# Altium footprint library 2.52-直插元件.PcbLib: 467 footprints (part 22 of 30)
Each footprint in its own frame and in the unit in brackets; x right, y up, seen from the top. Pads: shape width x height; smd on the part's side, far side on the other; paste and mask are expansions set on the pad; w line width, h text height; cw(c..) or ccw(c..) is an arc to the next point about the centre after c.
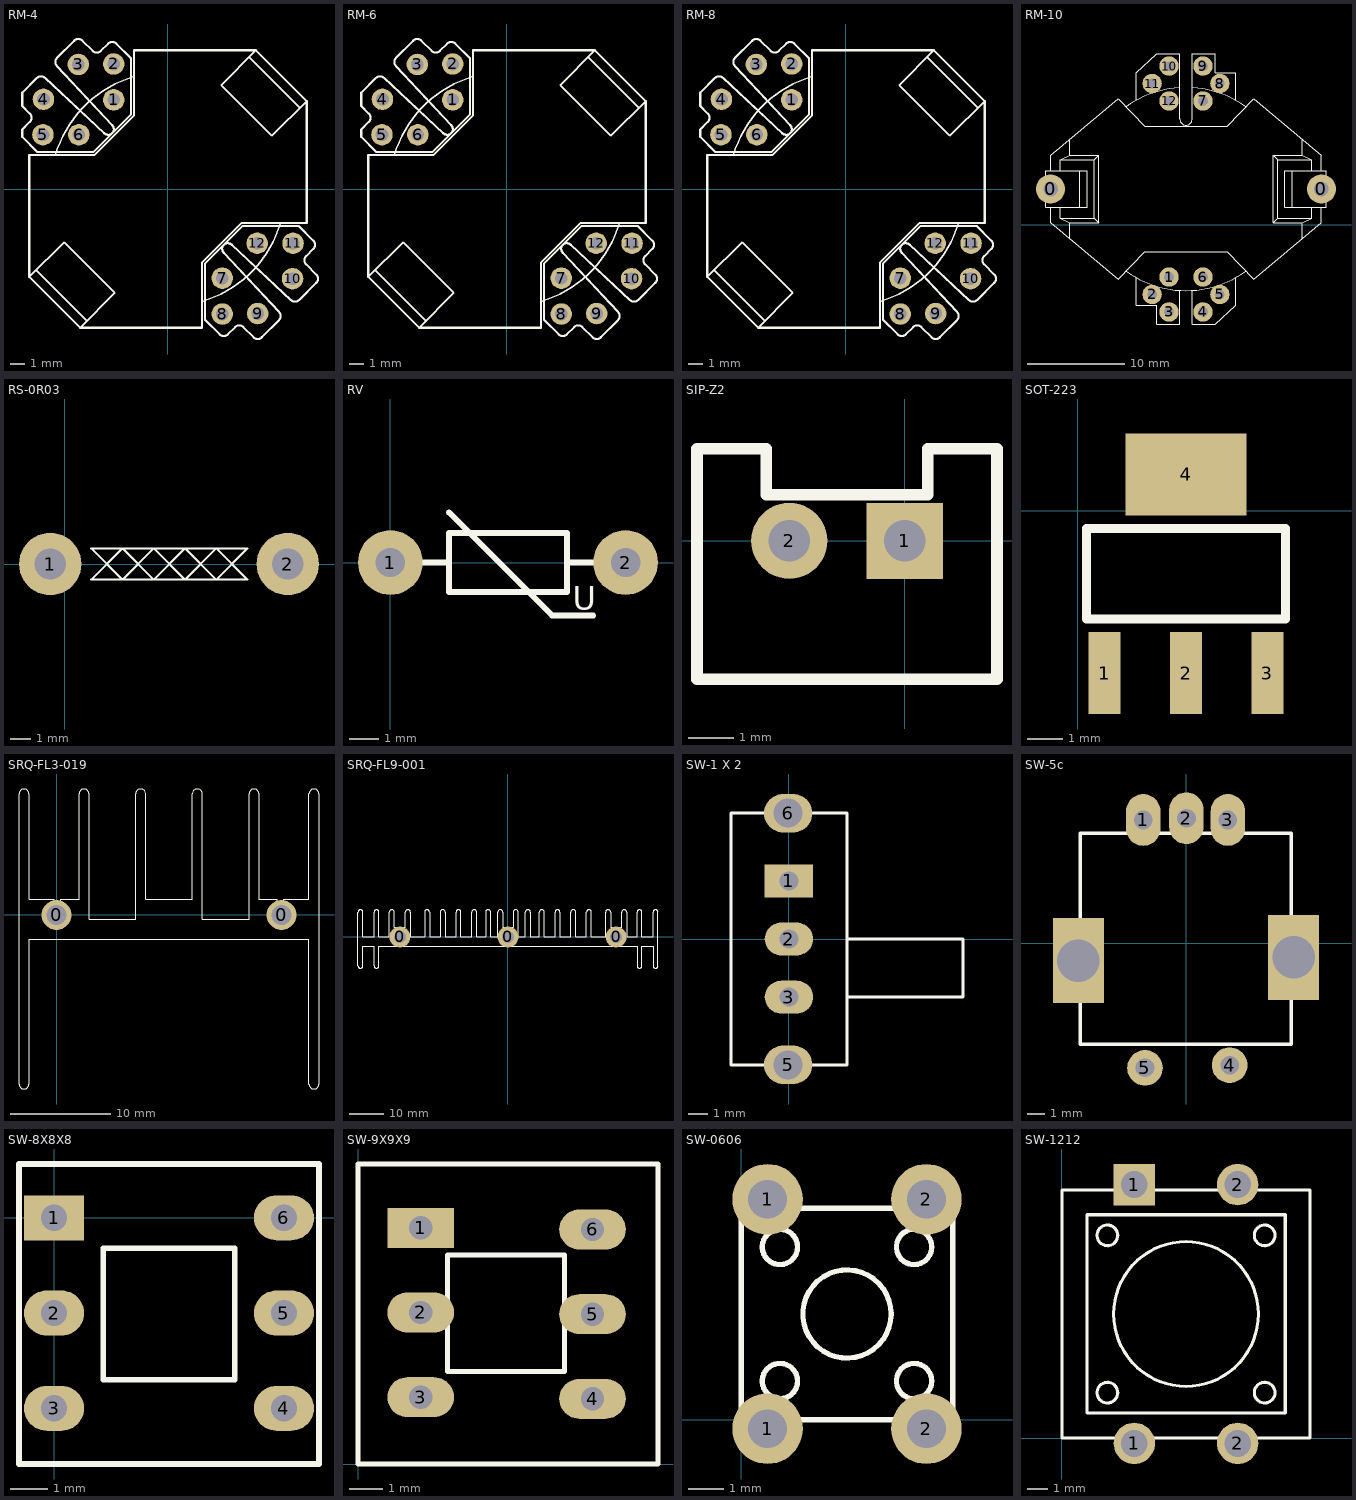
[diagram p21: the footprints below, top view; thin cyan lines are the x and y axes]

## RM-4 [mil]
pads (12):
  round 60 hole 35.43: 1(-151.72,249.16) 2(-151.72,349.38) 3(-250.55,347.99) 4(-347.99,250.55) 5(-349.38,151.72) 6(-249.16,151.72) 7(151.72,-249.16) 8(151.72,-349.38) 9(250.55,-347.99) 10(347.99,-250.55) 11(349.38,-151.72) 12(249.16,-151.72)
Top Overlay:
  lines w3.94: -387.66,-245.68 -290.22,-148.24 -148.24,-290.22 -245.68,-387.66 ; -368.59,-226.61 -226.61,-368.59 ; -314.81,94.69 cw(c0,0) -94.74,314.79 ; 94.69,-314.81 ccw(c0,0) 314.79,-94.73 ; 226.61,368.59 368.59,226.61 ; 245.68,387.66 148.24,290.22 290.22,148.24 387.66,245.68
  lines w5.91: -407.35,145.67 -364.69,103 -208.79,103 -103,208.79 ; -407.35,146.42 -407.34,166.14 -385.93,187.55 ccw(c-397.37,198.99) -385.93,210.43 -407.34,231.84 ; -407.34,231.96 -407.34,269.03 -366.33,310.04 cw(c-354.89,298.6) -343.45,310.04 ; -343.1,310.41 -178.4,155.77 ; -310.41,343.1 -155.77,178.4 ; -310.1,366.39 -262.05,414.44 cw(c-250.61,403) -239.16,414.44 -210.66,385.93 ; -310.04,343.45 cw(c-298.6,354.89) -310.04,366.33 ; -210.43,385.93 ccw(c-198.99,397.37) -187.55,385.93 -167.4,406.09 cw(c-155.95,394.64) -144.51,406.09 -103.37,364.94 ccw(c-103.31,365) -103.25,364.94 -103.25,208.93 ; -178.22,155.95 ccw(c-167.09,167.09) -155.95,178.22 ; 103,-364.69 103,-208.79 208.79,-103 ; 103.37,-364.94 144.51,-406.09 ccw(c155.95,-394.64) 167.39,-406.09 187.55,-385.93 cw(c198.99,-397.37) 210.43,-385.93 ; 155.77,-178.4 310.41,-343.1 ; 155.95,-178.22 cw(c167.09,-167.09) 178.22,-155.95 ; 178.4,-155.77 343.1,-310.41 ; 208.93,-103.25 364.94,-103.25 ; 210.66,-385.93 239.16,-414.44 ccw(c250.61,-403) 262.05,-414.44 310.1,-366.39 ; 310.04,-366.33 ccw(c298.6,-354.89) 310.04,-343.45 ; 343.45,-310.04 ccw(c354.89,-298.6) 366.33,-310.04 ; 364.94,-103.37 406.09,-144.51 cw(c394.64,-155.95) 406.09,-167.39 385.93,-187.55 ccw(c397.37,-198.99) 385.93,-210.43 ; 366.39,-310.1 414.44,-262.05 ccw(c403,-250.61) 414.44,-239.16 385.93,-210.66 ; -387.66,-245.68 -245.68,-387.66 94.65,-387.66 94.65,-206.01 206.01,-94.65 387.66,-94.65 387.66,245.68 245.68,387.66 -94.65,387.66 -94.65,206.01 -206.01,94.65 -387.66,94.65 -387.66,-245.68
3D body "rm8.STEP": height 647.05, standoff -116.73, extent -417.83,-417.83 417.83,417.83

## RM-6 [mil]
pads (12):
  round 60 hole 35.43: 1(-151.72,249.16) 2(-151.72,349.38) 3(-250.55,347.99) 4(-347.99,250.55) 5(-349.38,151.72) 6(-249.16,151.72) 7(151.72,-249.16) 8(151.72,-349.38) 9(250.55,-347.99) 10(347.99,-250.55) 11(349.38,-151.72) 12(249.16,-151.72)
Top Overlay:
  lines w3.94: -387.66,-245.68 -290.22,-148.24 -148.24,-290.22 -245.68,-387.66 ; -368.59,-226.61 -226.61,-368.59 ; -314.81,94.69 cw(c0,0) -94.74,314.79 ; 94.69,-314.81 ccw(c0,0) 314.79,-94.73 ; 226.61,368.59 368.59,226.61 ; 245.68,387.66 148.24,290.22 290.22,148.24 387.66,245.68
  lines w5.91: -407.35,145.67 -364.69,103 -208.79,103 -103,208.79 ; -407.35,146.42 -407.34,166.14 -385.93,187.55 ccw(c-397.37,198.99) -385.93,210.43 -407.34,231.84 ; -407.34,231.96 -407.34,269.03 -366.33,310.04 cw(c-354.89,298.6) -343.45,310.04 ; -343.1,310.41 -178.4,155.77 ; -310.41,343.1 -155.77,178.4 ; -310.1,366.39 -262.05,414.44 cw(c-250.61,403) -239.16,414.44 -210.66,385.93 ; -310.04,343.45 cw(c-298.6,354.89) -310.04,366.33 ; -210.43,385.93 ccw(c-198.99,397.37) -187.55,385.93 -167.4,406.09 cw(c-155.95,394.64) -144.51,406.09 -103.37,364.94 ccw(c-103.31,365) -103.25,364.94 -103.25,208.93 ; -178.22,155.95 ccw(c-167.09,167.09) -155.95,178.22 ; 103,-364.69 103,-208.79 208.79,-103 ; 103.37,-364.94 144.51,-406.09 ccw(c155.95,-394.64) 167.39,-406.09 187.55,-385.93 cw(c198.99,-397.37) 210.43,-385.93 ; 155.77,-178.4 310.41,-343.1 ; 155.95,-178.22 cw(c167.09,-167.09) 178.22,-155.95 ; 178.4,-155.77 343.1,-310.41 ; 208.93,-103.25 364.94,-103.25 ; 210.66,-385.93 239.16,-414.44 ccw(c250.61,-403) 262.05,-414.44 310.1,-366.39 ; 310.04,-366.33 ccw(c298.6,-354.89) 310.04,-343.45 ; 343.45,-310.04 ccw(c354.89,-298.6) 366.33,-310.04 ; 364.94,-103.37 406.09,-144.51 cw(c394.64,-155.95) 406.09,-167.39 385.93,-187.55 ccw(c397.37,-198.99) 385.93,-210.43 ; 366.39,-310.1 414.44,-262.05 ccw(c403,-250.61) 414.44,-239.16 385.93,-210.66 ; -387.66,-245.68 -387.66,94.65 -206.01,94.65 -94.65,206.01 -94.65,387.66 245.68,387.66 387.66,245.68 387.66,-94.65 206.01,-94.65 94.65,-206.01 94.65,-387.66 -245.68,-387.66 -387.66,-245.68
3D body "rm8.STEP": height 647.05, standoff -116.73, extent -417.83,-417.83 417.83,417.83

## RM-8 [mil]
pads (12):
  round 60 hole 35.43: 1(-151.72,249.16) 2(-151.72,349.38) 3(-250.55,347.99) 4(-347.99,250.55) 5(-349.38,151.72) 6(-249.16,151.72) 7(151.72,-249.16) 8(151.72,-349.38) 9(250.55,-347.99) 10(347.99,-250.55) 11(349.38,-151.72) 12(249.16,-151.72)
Top Overlay:
  lines w3.94: -387.66,-245.68 -290.22,-148.24 -148.24,-290.22 -245.68,-387.66 ; -368.59,-226.61 -226.61,-368.59 ; -314.81,94.69 cw(c0,0) -94.74,314.79 ; 94.69,-314.81 ccw(c0,0) 314.79,-94.73 ; 226.61,368.59 368.59,226.61 ; 245.68,387.66 148.24,290.22 290.22,148.24 387.66,245.68
  lines w5.91: -407.35,145.67 -364.69,103 -208.79,103 -103,208.79 ; -407.35,146.42 -407.34,166.14 -385.93,187.55 ccw(c-397.37,198.99) -385.93,210.43 -407.34,231.84 ; -407.34,231.96 -407.34,269.03 -366.33,310.04 cw(c-354.89,298.6) -343.45,310.04 ; -343.1,310.41 -178.4,155.77 ; -310.41,343.1 -155.77,178.4 ; -310.1,366.39 -262.05,414.44 cw(c-250.61,403) -239.16,414.44 -210.66,385.93 ; -310.04,343.45 cw(c-298.6,354.89) -310.04,366.33 ; -210.43,385.93 ccw(c-198.99,397.37) -187.55,385.93 -167.4,406.09 cw(c-155.95,394.64) -144.51,406.09 -103.37,364.94 ccw(c-103.31,365) -103.25,364.94 -103.25,208.93 ; -178.22,155.95 ccw(c-167.09,167.09) -155.95,178.22 ; 103,-364.69 103,-208.79 208.79,-103 ; 103.37,-364.94 144.51,-406.09 ccw(c155.95,-394.64) 167.39,-406.09 187.55,-385.93 cw(c198.99,-397.37) 210.43,-385.93 ; 155.77,-178.4 310.41,-343.1 ; 155.95,-178.22 cw(c167.09,-167.09) 178.22,-155.95 ; 178.4,-155.77 343.1,-310.41 ; 208.93,-103.25 364.94,-103.25 ; 210.66,-385.93 239.16,-414.44 ccw(c250.61,-403) 262.05,-414.44 310.1,-366.39 ; 310.04,-366.33 ccw(c298.6,-354.89) 310.04,-343.45 ; 343.45,-310.04 ccw(c354.89,-298.6) 366.33,-310.04 ; 364.94,-103.37 406.09,-144.51 cw(c394.64,-155.95) 406.09,-167.39 385.93,-187.55 ccw(c397.37,-198.99) 385.93,-210.43 ; 366.39,-310.1 414.44,-262.05 ccw(c403,-250.61) 414.44,-239.16 385.93,-210.66 ; -387.66,-245.68 -387.66,94.65 -206.01,94.65 -94.65,206.01 -94.65,387.66 245.68,387.66 387.66,245.68 387.66,-94.65 206.01,-94.65 94.65,-206.01 94.65,-387.66 -245.68,-387.66 -387.66,-245.68
3D body "rm8.STEP": height 647.05, standoff -116.73, extent -417.83,-417.83 417.83,417.83

## RM-10 [mm] "封装库来自淘宝卖家 ID：黄晶宝石"
pads (14):
  round 3 hole 1.5: 0(12.044,3.671) 0(40.044,3.671)
  round 2 hole 1: 1(24.294,-5.429) 2(22.544,-7.229) 3(24.294,-9.029) 4(27.794,-9.029) 5(29.544,-7.229) 6(27.794,-5.429) 7(27.794,12.771) 8(29.544,14.571) 9(27.794,16.371) 10(24.294,16.371) 11(22.544,14.571) 12(24.294,12.771)
Top Overlay:
  lines w0.1: 12.044,1.754 12.044,0.171 19.044,-5.679 21.794,-2.829 30.294,-2.829 33.044,-5.679 40.044,0.171 40.044,1.754 ; 12.044,5.575 12.044,7.171 19.044,13.021 21.794,10.171 30.294,10.171 33.044,13.021 40.044,7.171 40.044,5.575 ; 13.044,1.754 13.044,0.671 ; 13.044,5.576 13.044,6.671 ; 14.044,-1.481 14.044,0.171 ; 14.044,8.837 14.044,7.171 ; 15.044,1.771 15.044,5.571 ; 19.857,12.155 cw(c26.044,3.671) 25.394,14.151 ; 19.871,-4.823 ccw(c26.044,3.671) 32.217,-4.823 ; 20.894,-5.482 20.894,-8.329 23.044,-8.329 23.044,-10.329 25.394,-10.329 25.394,-6.82 ; 20.894,12.831 20.894,15.671 23.044,17.671 25.394,17.671 25.394,10.92 ccw(c26.044,10.92) 26.694,10.92 26.694,17.671 29.044,17.671 29.044,15.671 31.194,15.671 31.194,12.832 ; 26.694,-6.818 26.694,-10.329 29.044,-10.329 31.194,-8.329 31.194,-5.482 ; 26.696,14.151 cw(c26.044,3.671) 32.217,12.165 ; 37.044,1.771 37.044,5.571 ; 38.044,-1.481 38.044,0.171 ; 38.044,8.837 38.044,7.171 ; 39.044,1.754 39.044,0.671 ; 39.044,5.576 39.044,6.671 ; 13.044,0.671 14.044,0.171 ; 13.044,0.671 16.544,0.671 ; 13.044,6.671 14.044,7.171 ; 13.044,6.671 16.544,6.671 ; 14.044,0.171 17.044,0.171 ; 14.044,7.171 17.044,7.171 ; 16.544,0.671 17.044,0.171 ; 16.544,0.671 16.544,6.671 ; 16.544,6.671 17.044,7.171 ; 17.044,0.171 17.044,7.171 ; 35.044,0.171 35.044,7.171 ; 35.044,0.171 38.044,0.171 ; 35.044,0.171 35.544,0.671 ; 35.044,7.171 38.044,7.171 ; 35.044,7.171 35.544,6.671 ; 35.544,0.671 39.044,0.671 ; 35.544,0.671 35.544,6.671 ; 35.544,6.671 39.044,6.671 ; 38.044,0.171 39.044,0.671 ; 38.044,7.171 39.044,6.671 ; 11.544,1.771 15.844,1.771 15.844,5.571 11.544,5.571 11.544,1.771 ; 36.244,1.771 36.244,5.571 40.544,5.571 40.544,1.771 36.244,1.771
3D body "User Library-RM10.STEP": height 16.5, standoff -3.4, extent 11.794,-10.701 40.294,18.043
3D body: height 13.5, standoff 3, extent 16.083,-6.309 36.005,13.651

## RS-0R03 [mm] "封装库来自淘宝卖家 ID：黄晶宝石"
pads (2):
  round 3 hole 1.5: 1(-0.7,0) 2(10.7,0)
Top Overlay:
  lines w0.1: 1.268,-0.75 2.768,0.75 4.268,-0.75 5.768,0.75 7.268,-0.75 8.768,0.75 1.268,0.75 2.768,-0.75 4.268,0.75 5.768,-0.75 7.268,0.75 8.768,-0.75 1.268,-0.75
3D body "User Library-615HR030E.step": height 6.5, standoff -2, extent -1.6,-1.2 11.6,1.2

## RV [mm]
pads (2):
  round 2.2 hole 1: 1(0,0) 2(8,0)
Top Overlay:
  lines w0.2: 0,0 2,0 ; 2,1.7 5.5,-1.8 6.9,-1.8 ; 6,0 8,0 ; 2,-1 2,1 6,1 6,-1 2,-1
  text "U" at 6.2,-1.6 h0.8

## SIP-Z2 [mil]
pads (2):
  rect 66x66 hole 36: 1(0,0)
  round 66 hole 36: 2(-100,0)
Top Overlay:
  lines w10: -180,-120 80,-120 80,0 80,80 20,80 20,40 -120,40 -120,80 -180,80 -180,-120

## SOT-223 [mm]
pads (4):
  rect 0.9x2.3 smd: 1(0.762,-4.572) 2(3.048,-4.572) 3(5.334,-4.572)
  rect 3.4x2.3 smd: 4(3.048,1.016)
Top Overlay:
  lines w0.254: 0.254,-3.048 5.842,-3.048 5.842,-0.508 0.254,-0.508 0.254,-3.048

## SRQ-FL3-019 [mm] "淘宝ID:黄晶宝石   店铺网址:https://shop463601444.taobao.com"
pads (2):
  round 3 hole 2: 0(0,0) 0(22.5,0)
Top Overlay:
  lines w0.1: 20.25,1.592 22.05,1.592 22.05,0.461 ; 20.25,1.6 20.25,12.1 ccw(c19.75,12.1) 19.25,12.1 19.25,-0.4 14.583,-0.4 14.583,12.1 ccw(c14.083,12.1) 13.583,12.1 13.583,1.6 8.917,1.6 8.917,12.1 ccw(c8.417,12.1) 7.917,12.1 7.917,-0.4 3.25,-0.4 3.25,12.1 ccw(c2.75,12.1) 2.25,12.1 2.25,1.6 0.45,1.6 0.45,0.469 cw(c0,0) -0.25,0.6 -0.25,1.6 -2.75,1.6 -2.75,1.61 -2.75,12.1 ccw(c-3.25,12.1) -3.75,12.1 -3.75,-16.9 ccw(c-3.25,-16.9) -2.75,-16.9 -2.75,-2.4 25.25,-2.4 25.25,-16.9 ccw(c25.75,-16.9) 26.25,-16.9 26.25,12.1 ccw(c25.75,12.1) 25.25,12.1 25.25,1.602 ; 22.05,0.461 ccw(c22.5,-0.008) 22.75,0.592 ; 22.75,0.592 22.75,1.592 25.25,1.592 25.25,1.602 ; 25.25,1.6 25.25,1.602
3D body: height 8, standoff -5, extent 21.75,-0.757 23.244,0.74
3D body: height 8, standoff -5, extent -0.744,-0.748 0.75,0.749
3D body: height 25, standoff 0, extent 25.25,-16.9 26.25,12.1
3D body: height 25, standoff 0, extent -3.746,-16.9 -2.75,12.1
3D body: height 25, standoff 0, extent 0.45,0.469 2.25,1.6
3D body: height 25, standoff 0, extent -2.75,0.6 -0.25,1.6
3D body: height 25, standoff 0, extent -2.75,-2.392 -0.01,0.005
3D body: height 25, standoff 0, extent -0.01,-2.392 2.25,0.013
3D body: height 25, standoff 0, extent 0.45,0.013 2.25,0.469
3D body: height 25, standoff 0, extent -2.75,0.005 -0.25,0.6
3D body: height 25, standoff 0, extent 22.75,-0.003 25.25,0.592
3D body: height 25, standoff 0, extent 20.25,0.005 22.05,0.461
3D body: height 25, standoff 0, extent 20.25,-2.4 22.51,0.005
3D body: height 25, standoff 0, extent 22.51,-2.4 25.25,-0.003
3D body: height 25, standoff 0, extent 22.75,0.592 25.25,1.592
3D body: height 25, standoff 0, extent 20.25,0.461 22.05,1.592
3D body: height 25, standoff 0, extent 2.25,-2.407 20.25,12.1
3D body: height 25, standoff 0, extent -3.746,-17.399 -2.75,-16.401
3D body: height 25, standoff 0, extent 25.254,-17.399 26.25,-16.401
3D body: height 25, standoff 0, extent 25.254,11.601 26.25,12.599
3D body: height 25, standoff 0, extent 19.254,11.601 20.25,12.599
3D body: height 25, standoff 0, extent 13.587,11.601 14.583,12.599
3D body: height 25, standoff 0, extent 7.921,11.601 8.917,12.599
3D body: height 25, standoff 0, extent 2.254,11.601 3.25,12.599
3D body: height 25, standoff 0, extent -3.746,11.601 -2.75,12.599

## SRQ-FL9-001 [mm] "封装库来自淘宝卖家 ID：黄晶宝石"
pads (3):
  round 6 hole 3.5: 0(-31,0) 0(0,0) 0(31,0)
Top Overlay:
  lines w0.1: -31.827,0.937 ccw(c-31,0) -30.172,0.937 ; -31.8,0.937 -31.8,2.8 -32.6,2.8 -32.6,7.1 ccw(c-33.3,7.1) -34,7.1 -34,0 -37,0 -37,7.1 ccw(c-37.7,7.1) -38.4,7.1 -38.4,0 -41.6,0 -41.6,7.1 ccw(c-42.3,7.1) -43,7.1 -43,-8.3 ccw(c-42.3,-8.3) -41.6,-8.3 -41.6,-2.7 -38.4,-2.7 -38.4,-8.3 ccw(c-37.7,-8.3) -37,-8.3 -37,-2.7 37,-2.7 37,-8.3 ccw(c37.7,-8.3) 38.4,-8.3 38.4,-2.7 41.6,-2.7 41.6,-8.3 ccw(c42.3,-8.3) 43,-8.3 43,7.1 ccw(c42.3,7.1) 41.6,7.1 41.6,0 38.4,0 38.4,7.1 ccw(c37.7,7.1) 37,7.1 37,0 34,0 34,7.1 ccw(c33.3,7.1) 32.6,7.1 32.6,2.8 31.8,2.8 31.8,0.937 ; -30.2,0.937 -30.2,2.8 -29.4,2.8 -29.4,7.1 cw(c-28.7,7.1) -28,7.1 -28,0 -23.9,0 -23.9,7.1 cw(c-23.2,7.1) -22.5,7.1 -22.5,0 -19.4,0 -19.4,7.1 cw(c-18.7,7.1) -18,7.1 -18,0 -14.9,0 -14.9,7.1 cw(c-14.2,7.1) -13.5,7.1 -13.5,0 -10.4,0 -10.4,7.1 cw(c-9.7,7.1) -9,7.1 -9,0 -6.4,0 -6.4,7.1 cw(c-5.7,7.1) -5,7.1 -5,0 -2.9,0 -2.9,7.1 cw(c-2.2,7.1) -1.5,7.1 -1.5,2.8 -0.827,2.8 -0.827,0.937 ccw(c0,0) 0.828,0.937 0.828,2.8 1.5,2.8 1.5,7.1 cw(c2.2,7.1) 2.9,7.1 2.9,0 5,0 5,7.1 cw(c5.7,7.1) 6.4,7.1 ; 6.4,7.1 6.4,0 9,0 9,7.1 cw(c9.7,7.1) 10.4,7.1 10.4,0 13.5,0 13.5,7.1 cw(c14.2,7.1) 14.9,7.1 14.9,0 18,0 18,7.1 cw(c18.7,7.1) 19.4,7.1 19.4,0 22.5,0 22.5,7.1 cw(c23.2,7.1) 23.9,7.1 23.9,0 28,0 28,7.1 cw(c28.7,7.1) 29.4,7.1 29.4,2.8 30.2,2.8 30.2,0.937 ; 30.173,0.937 ccw(c31,0) 31.828,0.937
3D body "ɢ?": height 33, standoff 0, extent -43,-9 43,7.8

## SW-1 X 2 [mm] "封装库来自淘宝卖家 ID：黄晶宝石"
pads (5):
  rect 2.5x1.7 hole 1: 1(0,3)
  oval 2.5x1.7 hole 1: 2(0,0) 3(0,-3)
  oval 2.5x2 hole 1.5: 5(-0.04,-6.5) 6(-0.04,6.5)
Top Overlay:
  lines w0.15: 3,-3 9,-3 9,0 3,0 ; -3,-6.5 -3,6.5 3,6.5 3,-6.5 -3,-6.5
3D body "User Library-SLIDE SWITCH SS12F23.STEP": height 5.25, standoff -3.85, extent -3.452,-6.5 9.447,6.5

## SW-5c [mil] "封装库来自淘宝卖家 ID：黄晶宝石"
pads (7):
  oval 80x120 hole 43.31: 1(-100,286) 2(0,290) 3(96,286)
  round 82.68 hole 43.31: 4(100,-282) 5(-96,-288)
  rect 118.11x196.85 hole 98.42: ""(-250,-40) ""(248,-32)
Top Overlay:
  lines w8: -245.43,-233.34 242.75,-233.34 242.75,254.85 -245.43,254.85 -245.43,-233.34
3D body "SW3dPS-Encoder Alpha RE111F-41B3N-15F-20P.STEP": height 840.55, standoff -123.26, extent -267.56,-293.93 270,289.93

## SW-8X8X8 [mm] "封装库来自淘宝卖家 ID：黄晶宝石"
pads (6):
  rect 1.6x1.2 hole 0.7: 1(0,0)
  oval 1.6x1.2 hole 0.7: 2(0,-2.54) 3(0,-5.08) 4(6.131,-5.08) 5(6.131,-2.54) 6(6.131,0)
Top Overlay:
  lines w0.15: -0.935,-6.565 -0.935,1.435 7.065,1.435 7.065,-6.565 -0.935,-6.565 ; 1.313,-4.318 4.818,-4.318 4.818,-0.813 1.313,-0.813 1.313,-4.318
3D body "User Library-PSM1-0-0.step": height 13.5, standoff -3.5, extent -0.935,-6.565 7.065,1.435

## SW-9X9X9 [mm] "封装库来自淘宝卖家 ID：黄晶宝石"
pads (6):
  rect 2x1.2 hole 0.7: 1(1.88,7.087)
  oval 2x1.2 hole 0.7: 2(1.88,4.547) 3(1.88,2.007) 4(7.036,1.956) 5(7.036,4.496) 6(7.036,7.036)
Top Overlay:
  lines w0.15: 0,0 9,0 9,9 0,9 0,0 ; 2.692,2.769 6.198,2.769 6.198,6.274 2.692,6.274 2.692,2.769
3D body "User Library-TL 2201.step": height 14, standoff -3.5, extent 0.25,0.25 8.75,8.75

## SW-0606 [mm] "封装库来自淘宝卖家 ID：黄晶宝石"
pads (4):
  round 2 hole 1.1: 1(0.75,-0.25) 1(0.75,6.25) 2(5.25,-0.25) 2(5.25,6.25)
Top Overlay:
  circle w0.15: c3,3 r1.25
  circle w0.15: c4.9,4.9 r0.5
  circle w0.15: c1.1,4.9 r0.5
  circle w0.15: c4.9,1.1 r0.5
  circle w0.15: c1.1,1.1 r0.5
  lines w0.15: 0,0 6,0 6,6 0,6 0,0
3D body "User Library-TS-1150-WP.STEP": height 5, standoff -3.5, extent -0.25,-1.134 6.25,7.134

## SW-1212 [mm] "封装库来自淘宝卖家 ID：黄晶宝石"
pads (4):
  rect 2x2 hole 1.3: 1(3.5,12.25)
  round 2 hole 1.3: 1(3.5,-0.25) 2(8.5,-0.25) 2(8.5,12.25)
Top Overlay:
  circle w0.15: c2.2,2.2 r0.5
  circle w0.15: c6,6 r3.5
  circle w0.15: c9.8,2.2 r0.5
  circle w0.15: c2.2,9.8 r0.5
  circle w0.15: c9.8,9.8 r0.5
  lines w0.15: 0,0 12,0 12,12 0,12 0,0 ; 1.219,1.219 1.219,10.795 10.795,10.795 10.795,1.219 1.219,1.219
3D body "User Library-SWT9.step": height 9.5, standoff -3.5, extent 0,-0.937 12,12.937